# Altium footprint library shared_lib.PcbLib: 65 footprints (part 3 of 5)
Each footprint in its own frame and in the unit in brackets; x right, y up, seen from the top. Pads: shape width x height; smd on the part's side, far side on the other; paste and mask are expansions set on the pad; w line width, h text height; cw(c..) or ccw(c..) is an arc to the next point about the centre after c.
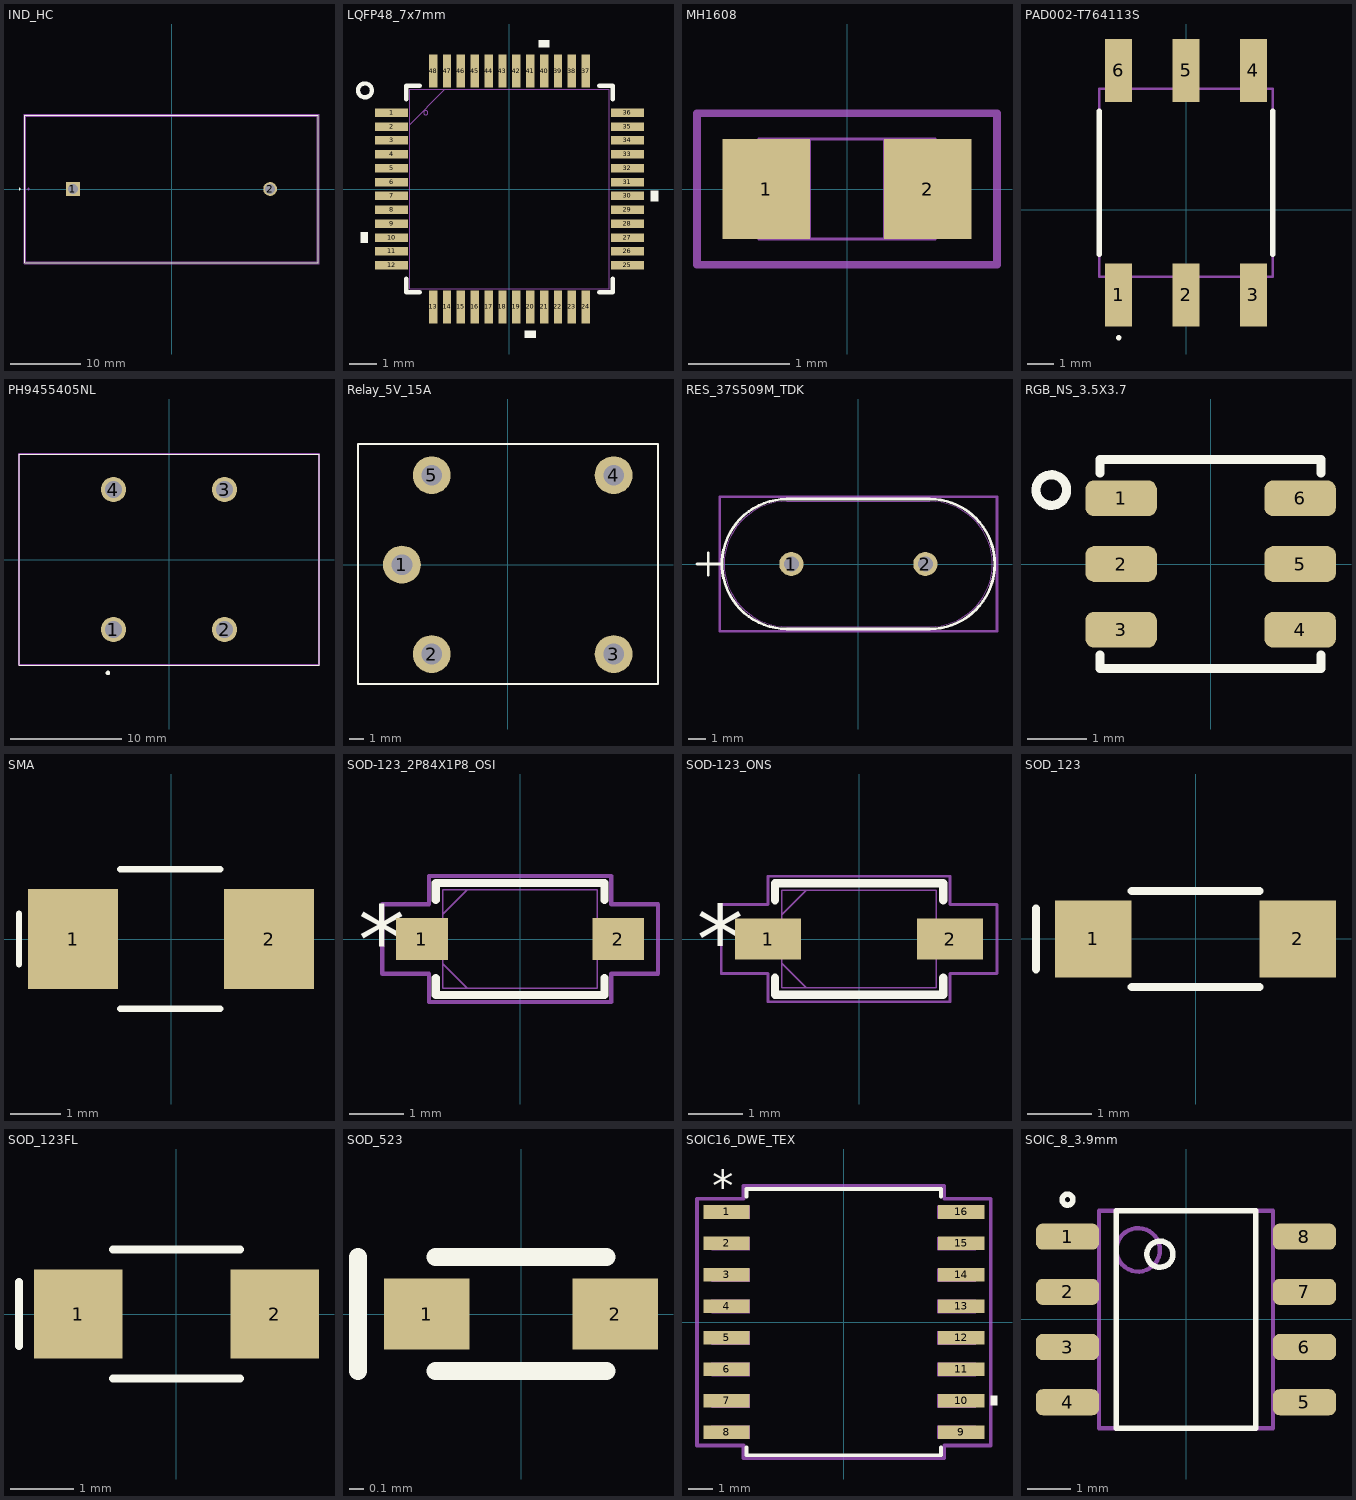
[diagram p2: the footprints below, top view; thin cyan lines are the x and y axes]

## IND_HC [mil]
pads (2):
  rect 77x77 / inner round 60 / far side rect 77x77 hole 57 paste-99999 mask+0: 1(-550,0)
  round 77 / inner round 60 / far side round 77 hole 57 paste-99999 mask+0: 2(550,0)
Top Overlay:
  circle w6: c-847.5,0 r3
  lines w6: -817.5,-411 -817.5,411 817.5,411 817.5,-411 -817.5,-411
Mechanical 13:
  circle w0: c-797.5,0 r3
  lines w1: -812.5,-406 -812.5,406 812.5,406 812.5,-406 -812.5,-406
Mechanical 15:
  lines w6: -822.5,-416 822.5,-416 822.5,416 -822.5,416 -822.5,-416
3D body "IND_HC_41p28x20p62-26p67_API.step": height 812.01, standoff -240.98, extent -812.48,-405.98 812.52,405.98

## LQFP48_7x7mm [mm]
pads (48):
  rect 1.194x0.305 smd paste+0 mask+0.046: 1(-4.25,2.75) 2(-4.25,2.25) 3(-4.25,1.75) 4(-4.25,1.25) 5(-4.25,0.75) 6(-4.25,0.25) 7(-4.25,-0.25) 8(-4.25,-0.75) 9(-4.25,-1.25) 10(-4.25,-1.75) 11(-4.25,-2.25) 12(-4.25,-2.75) 25(4.25,-2.75) 26(4.25,-2.25) 27(4.25,-1.75) 28(4.25,-1.25) 29(4.25,-0.75) 30(4.25,-0.25) 31(4.25,0.25) 32(4.25,0.75) 33(4.25,1.25) 34(4.25,1.75) 35(4.25,2.25) 36(4.25,2.75)
  rect 0.305x1.194 smd paste+0 mask+0.046: 13(-2.75,-4.25) 14(-2.25,-4.25) 15(-1.75,-4.25) 16(-1.25,-4.25) 17(-0.75,-4.25) 18(-0.25,-4.25) 19(0.25,-4.25) 20(0.75,-4.25) 21(1.25,-4.25) 22(1.75,-4.25) 23(2.25,-4.25) 24(2.75,-4.25) 37(2.75,4.25) 38(2.25,4.25) 39(1.75,4.25) 40(1.25,4.25) 41(0.75,4.25) 42(0.25,4.25) 43(-0.25,4.25) 44(-0.75,4.25) 45(-1.25,4.25) 46(-1.75,4.25) 47(-2.25,4.25) 48(-2.75,4.25)
Top Overlay:
  circle w0.152: c-5.207,3.556 r0.251
  region: -5.101,-1.559 -5.355,-1.559 -5.355,-1.94 -5.101,-1.94
  region: 5.101,-0.059 5.355,-0.059 5.355,-0.44 5.101,-0.44
  region: 1.441,5.101 1.06,5.101 1.06,5.355 1.441,5.355
  region: 0.941,-5.101 0.56,-5.101 0.56,-5.355 0.941,-5.355
  lines w0.152: -3.721,-3.235 -3.721,-3.721 -3.235,-3.721 ; -3.721,3.235 -3.721,3.721 -3.235,3.721 ; 3.235,-3.721 3.721,-3.721 3.721,-3.235 ; 3.235,3.721 3.721,3.721 3.721,3.235
Mechanical 13:
  circle w0: c-3.018,2.75 r0.076
  lines w0.025: -3.594,2.324 -2.324,3.594 ; -3.594,-3.594 3.594,-3.594 3.594,3.594 -3.594,3.594 -3.594,-3.594
3D body "LQFP48-7x7mm.step": height 1.6, standoff 0, extent -4.497,-4.497 4.497,4.497

## MH1608 [mil]
pads (2):
  rect 34x39 smd paste+0 mask+0: 1(-31.5,0) 2(31.5,0)
Mechanical 13:
  lines w1: -34.5,-19.5 -34.5,19.5 ; -34.5,-19.5 34.5,-19.5 ; -34.5,-19.5 -14.5,-19.5 -14.5,19.5 -34.5,19.5 ; -34.5,-19.5 -34.5,19.5 ; -34.5,19.5 34.5,19.5 ; 34.5,-19.5 34.5,19.5 ; 34.5,-19.5 34.5,19.5 ; 34.5,-19.5 14.5,-19.5 14.5,19.5 34.5,19.5
Mechanical 15:
  lines w3: -58.5,-29.5 58.5,-29.5 58.5,29.5 -58.5,29.5 -58.5,-29.5
3D body "IND_BOURNS_MH1608.step": height 39.02, standoff 0, extent -34.49,-19.49 34.49,19.49

## PAD002-T764113S [mm]
pads (6):
  rect 1.02x2.375 smd: 1(-2.54,-3.221) 2(0,-3.221) 3(2.54,-3.221) 4(2.54,5.253) 5(0,5.253) 6(-2.54,5.253)
Top Overlay:
  lines w0.1: -2.54,-4.884 cw(c-2.54,-4.834) -2.54,-4.784 ; -2.54,-4.884 ccw(c-2.54,-4.834) -2.54,-4.784 ; -2.54,-4.884 cw(c-2.54,-4.834) -2.54,-4.784
  lines w0.2: -3.275,-1.684 -3.275,3.716 ; 3.275,-1.684 3.275,3.716
Mechanical 15:
  lines w0.1: -3.275,-2.534 -3.275,4.566 3.275,4.566 3.275,-2.534 -3.275,-2.534
3D body "PAD002-T764113S.stp": height 4.5, standoff 0, extent -3.342,-3.947 3.208,5.903

## PH9455405NL [mm]
pads (4):
  round 2.25 hole 1.5: 1(-5,-6.3) 2(5,-6.3) 3(5,6.3) 4(-5,6.3)
Top Overlay:
  lines w0.1: -13.5,-9.5 -13.5,9.5 13.5,9.5 13.5,-9.5 -13.5,-9.5
  lines w0.2: -5.6,-10.2 ccw(c-5.5,-10.2) -5.4,-10.2 ccw(c-5.5,-10.2) -5.6,-10.2
Mechanical 15:
  lines w0.2: -13.5,-9.5 -13.5,9.5 13.5,9.5 13.5,-9.5 -13.5,-9.5
3D body "PH9455.405NL.stp": height 23.69, standoff -4.6, extent -12.717,-8.95 12.877,9.05

## Relay_5V_15A [mm]
pads (5):
  round 2.54 hole 1.397: 1(-7.1,0) 2(-5.1,-6) 3(7.1,-6) 4(7.1,6) 5(-5.1,6)
Top Overlay:
  lines w0.127: -10.045,-8.007 10.072,-8.007 10.072,8.097 -10.045,8.097 -10.045,-8.007
3D body "User Library-RELAY  12MMx12MM SQUARE.STEP": height 15.02, standoff -1.98, extent -10.102,-7.999 9.898,8.001

## RES_37S509M_TDK [mil]
pads (2):
  round 53 hole 33 paste-99999 mask+0: 1(-147.64,0) 2(147.64,0)
Top Overlay:
  lines w6: -355.5,0 -305.5,0 ; -330.5,-25 -330.5,25 ; -157.5,-143 cw(c-157.5,0) -157.5,143 157.5,143 cw(c157.5,0) 300.5,0 cw(c157.5,0) 157.5,-143 -157.5,-143
Mechanical 13:
  lines w1: -355.5,0 -305.5,0 ; -330.5,-25 -330.5,25 ; -157.5,-138 cw(c-157.5,0) -157.5,138 157.5,138 cw(c157.5,0) 157.5,-138 -157.5,-138
Mechanical 15:
  lines w6: -305.5,-148 305.5,-148 305.5,148 -305.5,148 -305.5,-148
3D body "RES_37S509M_TDK.step": height 590.98, standoff -163.07, extent -295.51,-137.99 295.51,137.99

## RGB_NS_3.5X3.7 [mm]
pads (6):
  rrect50% 1.2x0.6 smd: 1(-1.5,1.1) 2(-1.5,0) 3(-1.5,-1.1) 4(1.5,-1.1) 5(1.5,0) 6(1.5,1.1)
Top Overlay:
  circle w0.152: c-2.669,1.238 r0.257
  lines w0.152: -1.85,-1.524 -1.85,-1.75 1.85,-1.75 1.85,-1.524 ; -1.85,1.524 -1.85,1.75 1.85,1.75 1.85,1.524
3D body: height 1, standoff 0, extent -1.849,-1.744 1.849,1.751

## SMA [mm]
pads (2):
  rect 1.8x2 smd: 1(-1.965,0) 2(1.965,0)
Top Overlay:
  lines w0.127: -3.048,-0.508 -3.048,0.508 ; -1.016,-1.397 0.984,-1.397 ; -1.016,1.397 0.984,1.397
3D body "SMASeries_LTF.step": height 2.34, standoff 0, extent -2.642,-1.397 2.642,1.397

## SOD-123_2P84X1P8_OSI [mil]
pads (2):
  rect 37.56x30.36 smd paste+0 mask+0: 1(-71,0) 2(71,0)
Top Overlay:
  lines w6: -61,-28.28 -61,-40.5 61,-40.5 61,-28.28 ; -61,28.28 -61,40.5 61,40.5 61,28.28
  text "*" at -117.28,-25 h50
Mechanical 13:
  lines w1: -56,-17.75 -38.25,-35.5 ; -56,17.75 -38.25,35.5 ; -76,-14 -76,14 -56,14 -56,-14 -76,-14 ; -56,-35.5 56,-35.5 56,35.5 -56,35.5 -56,-35.5 ; 56,-14 56,14 76,14 76,-14 56,-14
Mechanical 15:
  lines w3: -99.78,-25.18 -99.78,25.18 -66,25.18 -66,45.5 66,45.5 66,25.18 99.78,25.18 99.78,-25.18 66,-25.18 66,-45.5 -66,-45.5 -66,-25.18 -99.78,-25.18
3D body "SOD-123_2P84X1P8_OSI.step": height 53.11, standoff 0, extent -75.98,-35.51 75.98,35.51

## SOD-123_ONS [mil]
pads (2):
  rect 48x30 smd paste+0 mask+0: 1(-66,0) 2(66,0)
Top Overlay:
  lines w6: -61,-28.1 -61,-40.5 61,-40.5 61,-28.1 ; -61,28.1 -61,40.5 61,40.5 61,28.1
  text "*" at -117.5,-25 h50
Mechanical 13:
  lines w1: -56,-17.75 -38.25,-35.5 ; -56,17.75 -38.25,35.5 ; -76,-14 -76,14 -56,14 -56,-14 -76,-14 ; -56,-35.5 56,-35.5 56,35.5 -56,35.5 -56,-35.5 ; 56,-14 56,14 76,14 76,-14 56,-14
Mechanical 15:
  lines w2: -100,-25 -100,25 -66,25 -66,45.5 66,45.5 66,25 100,25 100,-25 66,-25 66,-45.5 -66,-45.5 -66,-25 -100,-25
3D body "SOD-123_ONS.step": height 53.11, standoff 0, extent -75.98,-35.51 75.98,35.51

## SOD_123 [mm]
pads (2):
  rect 1.2x1.2 smd: 1(-1.6,0) 2(1.6,0)
Top Overlay:
  lines w0.127: -2.5,-0.475 -2.5,0.475 ; -1,-0.75 1,-0.75 ; -1,0.749 1,0.749
3D body "SOD123.step": height 1.28, standoff 0.01, extent -1.926,-0.8 1.774,0.8

## SOD_123FL [mm]
pads (2):
  rect 1.4x1.4 smd: 1(-1.55,0) 2(1.55,0)
Top Overlay:
  lines w0.127: -2.486,-0.508 -2.486,0.508 ; -1,-1.016 1,-1.016 ; -1,1.016 1,1.016
3D body "SOD-123F_LTF.step": height 1.09, standoff 0, extent -1.956,-1.003 1.956,1.003

## SOD_523 [mm]
pads (2):
  rect 0.6x0.5 smd: 1(-0.66,0) 2(0.66,0)
Top Overlay:
  lines w0.127: -1.143,-0.4 -1.143,0.4 ; -0.6,-0.4 0.6,-0.4 ; -0.6,0.4 0.6,0.4
3D body: height 0.6, standoff 0, extent -0.6,-0.4 0.6,0.4

## SOIC16_DWE_TEX [mm]
pads (16):
  rect 1.874x0.558 smd paste+0 mask+0: 1(-4.734,4.445) 2(-4.734,3.175) 3(-4.734,1.905) 4(-4.734,0.635) 5(-4.734,-0.635) 6(-4.734,-1.905) 7(-4.734,-3.175) 8(-4.734,-4.445) 9(4.734,-4.445) 10(4.734,-3.175) 11(4.734,-1.905) 12(4.734,-0.635) 13(4.734,0.635) 14(4.734,1.905) 15(4.734,3.175) 16(4.734,4.445)
Top Overlay:
  region: 5.925,-2.984 6.179,-2.984 6.179,-3.365 5.925,-3.365
  lines w0.152: -3.924,-5.057 -3.924,-5.372 3.924,-5.372 3.924,-5.057 ; -3.924,5.057 -3.924,5.372 3.924,5.372 3.924,5.057
  text "*" at -5.306,4.876 h1.27
Mechanical 13:
  lines w0.025: -5.321,-4.699 -5.321,-4.191 -3.797,-4.191 -3.797,-4.699 -5.321,-4.699 ; -5.321,-3.429 -5.321,-2.921 -3.797,-2.921 -3.797,-3.429 -5.321,-3.429 ; -5.321,-2.159 -5.321,-1.651 -3.797,-1.651 -3.797,-2.159 -5.321,-2.159 ; -5.321,-0.889 -5.321,-0.381 -3.797,-0.381 -3.797,-0.889 -5.321,-0.889 ; -5.321,0.381 -5.321,0.889 -3.797,0.889 -3.797,0.381 -5.321,0.381 ; -5.321,1.651 -5.321,2.159 -3.797,2.159 -3.797,1.651 -5.321,1.651 ; -5.321,2.921 -5.321,3.429 -3.797,3.429 -3.797,2.921 -5.321,2.921 ; -5.321,4.191 -5.321,4.699 -3.797,4.699 -3.797,4.191 -5.321,4.191 ; 3.797,-4.699 3.797,-4.191 5.321,-4.191 5.321,-4.699 3.797,-4.699 ; 3.797,-3.429 3.797,-2.921 5.321,-2.921 5.321,-3.429 3.797,-3.429 ; 3.797,-2.159 3.797,-1.651 5.321,-1.651 5.321,-2.159 3.797,-2.159 ; 3.797,-0.889 3.797,-0.381 5.321,-0.381 5.321,-0.889 3.797,-0.889 ; 3.797,0.381 3.797,0.889 5.321,0.889 5.321,0.381 3.797,0.381 ; 3.797,1.651 3.797,2.159 5.321,2.159 5.321,1.651 3.797,1.651 ; 3.797,2.921 3.797,3.429 5.321,3.429 5.321,2.921 3.797,2.921 ; 3.797,4.191 3.797,4.699 5.321,4.699 5.321,4.191 3.797,4.191
Mechanical 15:
  lines w0.152: -5.925,-4.978 -5.925,4.978 -4.051,4.978 -4.051,5.499 4.051,5.499 4.051,4.978 5.925,4.978 5.925,-4.978 4.051,-4.978 4.051,-5.499 -4.051,-5.499 -4.051,-4.978 -5.925,-4.978
3D body "SOIC16_DWE_TEX.step": height 2.64, standoff 0, extent -5.339,-5.238 5.303,5.252

## SOIC_8_3.9mm [mm]
pads (8):
  rrect50% 1.45x0.6 smd: 1(-2.725,1.905) 2(-2.725,0.635) 3(-2.725,-0.635) 4(-2.725,-1.905) 5(2.725,-1.905) 6(2.725,-0.635) 7(2.725,0.635) 8(2.725,1.905)
Top Overlay:
  circle w0.127: c-2.725,2.755 r0.125
  circle w0.127: c-0.6,1.5 r0.3
  lines w0.127: -1.6,-2.5 -1.6,2.5 1.6,2.5 1.6,-2.5 -1.6,-2.5
Mechanical 1:
  circle w0.1: c-1.1,1.6 r0.5
  lines w0.1: -2,-2.5 2,-2.5 2,2.5 -2,2.5 -2,-2.5
3D body "SOIC127P600X173-8N.step": height 1.73, standoff 0, extent -3.01,-2.5 3.01,2.5